# Altium footprint library base.PcbLib: 116 footprints (part 6 of 8)
Each footprint in its own frame and in the unit in brackets; x right, y up, seen from the top. Pads: shape width x height; smd on the part's side, far side on the other; paste and mask are expansions set on the pad; w line width, h text height; cw(c..) or ccw(c..) is an arc to the next point about the centre after c.
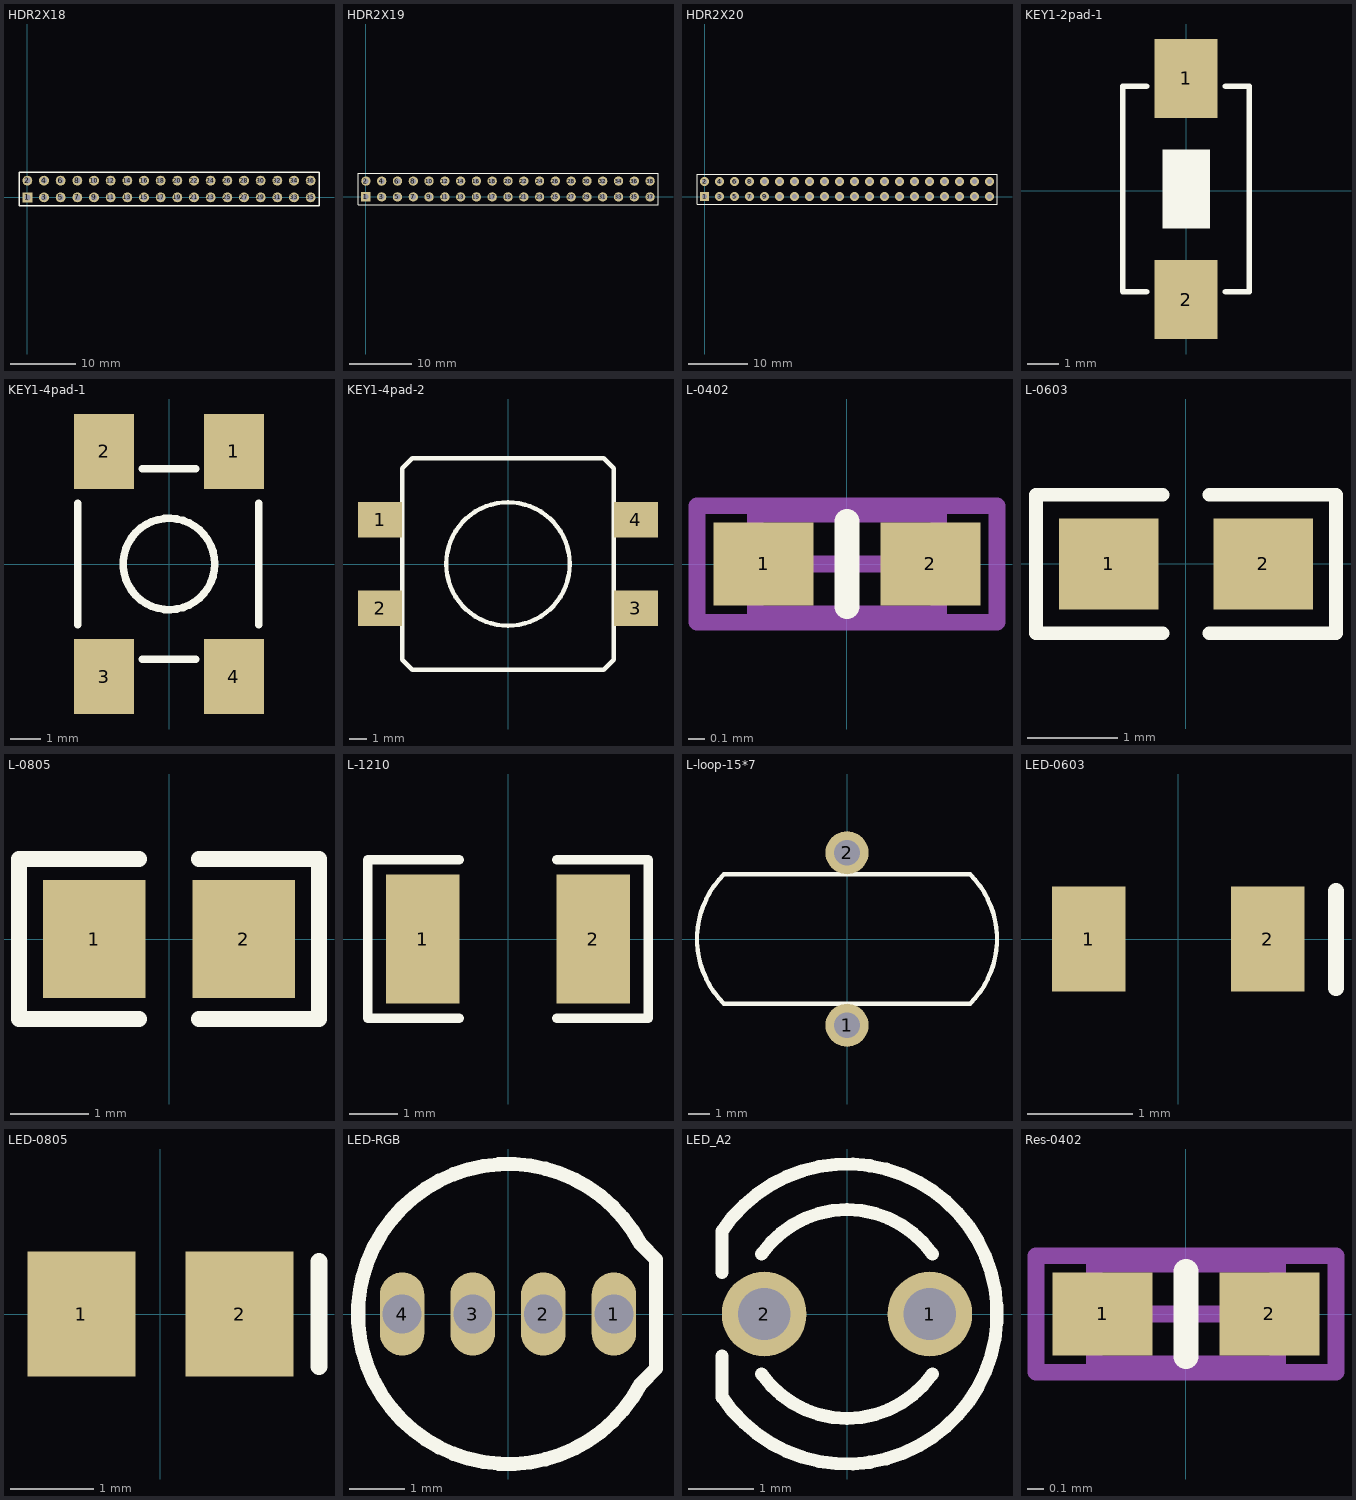
[diagram p5: the footprints below, top view; thin cyan lines are the x and y axes]

## HDR2X18 [mm] "Connector; Header; 18x2 Position"
pads (36):
  rect 1.5x1.5 hole 0.9: 1(0,0)
  round 1.5 hole 0.9: 2(0,2.54) 3(2.54,0) 4(2.54,2.54) 5(5.08,0) 6(5.08,2.54) 7(7.62,0) 8(7.62,2.54) 9(10.16,0) 10(10.16,2.54) 11(12.7,0) 12(12.7,2.54) 13(15.24,0) 14(15.24,2.54) 15(17.78,0) 16(17.78,2.54) 17(20.32,0) 18(20.32,2.54) 19(22.86,0) 20(22.86,2.54) 21(25.4,0) 22(25.4,2.54) 23(27.94,0) 24(27.94,2.54) 25(30.48,0) 26(30.48,2.54) 27(33.02,0) 28(33.02,2.54) 29(35.56,0) 30(35.56,2.54) 31(38.1,0) 32(38.1,2.54) 33(40.64,0) 34(40.64,2.54) 35(43.18,0) 36(43.18,2.54)
Top Overlay:
  lines w0.2: -1.27,-1.27 44.45,-1.27 44.45,3.81 -1.27,3.81 -1.27,-1.27
3D body "HEADER 18X2.STEP": height 10.1, standoff -1.5, extent -1.27,-1.27 44.45,3.81

## HDR2X19 [mm] "Connector; Header; 19x2 Position"
pads (38):
  rect 1.5x1.5 hole 0.9: 1(0,0)
  round 1.5 hole 0.9: 2(0,2.54) 3(2.54,0) 4(2.54,2.54) 5(5.08,0) 6(5.08,2.54) 7(7.62,0) 8(7.62,2.54) 9(10.16,0) 10(10.16,2.54) 11(12.7,0) 12(12.7,2.54) 13(15.24,0) 14(15.24,2.54) 15(17.78,0) 16(17.78,2.54) 17(20.32,0) 18(20.32,2.54) 19(22.86,0) 20(22.86,2.54) 21(25.4,0) 22(25.4,2.54) 23(27.94,0) 24(27.94,2.54) 25(30.48,0) 26(30.48,2.54) 27(33.02,0) 28(33.02,2.54) 29(35.56,0) 30(35.56,2.54) 31(38.1,0) 32(38.1,2.54) 33(40.64,0) 34(40.64,2.54) 35(43.18,0) 36(43.18,2.54) 37(45.72,0) 38(45.72,2.54)
Top Overlay:
  lines w0.2: -1.27,-1.27 -1.27,3.81 46.99,3.81 46.99,-1.27 -1.27,-1.27
3D body "HEADER 19X2.STEP": height 10.1, standoff -1.5, extent -1.27,-1.27 46.99,3.81

## HDR2X20 [mm] "Connector; Header; 20x2 Position"
pads (40):
  rect 1.5x1.5 hole 0.9: 1(0,0)
  round 1.5 hole 0.9: 2(0,2.54) 3(2.54,0) 4(2.54,2.54) 5(5.08,0) 6(5.08,2.54) 7(7.62,0) 8(7.62,2.54) 9(10.16,0) 10(10.16,2.54) 11(12.7,0) 12(12.7,2.54) 13(15.24,0) 14(15.24,2.54) 15(17.78,0) 16(17.78,2.54) 17(20.32,0) 18(20.32,2.54) 19(22.86,0) 20(22.86,2.54) 21(25.4,0) 22(25.4,2.54) 23(27.94,0) 24(27.94,2.54) 25(30.48,0) 26(30.48,2.54) 27(33.02,0) 28(33.02,2.54) 29(35.56,0) 30(35.56,2.54) 31(38.1,0) 32(38.1,2.54) 33(40.64,0) 34(40.64,2.54) 35(43.18,0) 36(43.18,2.54) 37(45.72,0) 38(45.72,2.54) 39(48.26,0) 40(48.26,2.54)
Top Overlay:
  lines w0.2: -1.27,-1.27 -1.27,3.81 49.53,3.81 49.53,-1.27 -1.27,-1.27
3D body "HEADER 20X2.STEP": height 10.1, standoff -1.5, extent -1.27,-1.27 49.53,3.81

## KEY1-2pad-1 [mm]
pads (2):
  rect 2x2.5 smd: 1(0,3.556) 2(0,-3.444)
Top Overlay:
  region: -0.747,1.309 -0.747,-1.191 0.753,-1.191 0.753,1.309
  lines w0.178: -1.25,-3.194 -2,-3.19 -2,3.306 -1.25,3.306 ; 1.25,-3.194 2,-3.194 2,3.306 1.25,3.306
3D body "User Library-switch-9.STEP": height 4.5, standoff -0.01, extent -1.725,-4.424 1.775,4.576

## KEY1-4pad-1 [mm] "6*6mm"
pads (4):
  rect 2x2.5 smd: 1(2.159,3.75) 2(-2.159,3.75) 3(-2.159,-3.75) 4(2.159,-3.75)
Top Overlay:
  circle w0.254: c0,0 r1.524
  lines w0.25: -3.048,-2.032 -3.048,2.032 ; -0.889,-3.175 0.889,-3.175 ; -0.889,3.175 0.889,3.175 ; 2.997,-2.032 2.997,2.032
3D body "SW-PB 6X6X4-SMD.STEP": height 5.5, standoff -0.03, extent -3.202,-5.021 3.142,5.013

## KEY1-4pad-2 [mm] "12*12"
pads (4):
  rect 2.5x2 smd: 1(-7.25,2.5) 2(-7.25,-2.5) 3(7.25,-2.5) 4(7.25,2.5)
Top Overlay:
  circle w0.254: c0,0 r3.5
  lines w0.25: -6,-5.43 -5.43,-6 5.43,-6 6,-5.43 6,5.43 5.43,6 -5.43,6 -6,5.43 -6,-5.43

## L-0402 [mm]
height 1.3
pads (2):
  rect 0.6x0.5 smd: 1(-0.5,0) 2(0.5,0)
Top Overlay:
  lines w0.15: 0,-0.254 0,0.254
Mechanical 13:
  lines w0.1: -0.55,-0.3 0.55,-0.3 0.55,0.3 -0.55,0.3 -0.55,-0.3
Mechanical 15:
  lines w0.1: -0.3,0 0.3,0 ; 0,-0.3 0,0.3 ; -0.9,-0.35 0.9,-0.35 0.9,0.35 -0.9,0.35 -0.9,-0.35
3D body "INDC1005(0402).STEP": height 0.49, standoff -0.01, extent -0.5,-0.305 0.5,0.295

## L-0603 [mm]
height 0.6
pads (2):
  rect 1.1x1 smd: 1(-0.85,0) 2(0.85,0)
Top Overlay:
  lines w0.15: -0.254,-0.762 -1.651,-0.762 -1.651,0.762 -0.254,0.762 ; 0.254,-0.762 1.651,-0.762 1.651,0.762 0.254,0.762
3D body "INDC1608(0603).STEP": height 0.78, standoff -0.01, extent -0.8,-0.483 0.8,0.467

## L-0805 [mm]
height 1.1
pads (2):
  rect 1.3x1.5 smd: 1(-0.95,0) 2(0.95,0)
Top Overlay:
  lines w0.2: -0.381,-1.016 -1.905,-1.016 -1.905,1.016 -0.381,1.016 ; 0.381,-1.016 1.905,-1.016 1.905,1.016 0.381,1.016
3D body "INDC2012(0805).STEP": height 0.94, standoff -0.01, extent -1,-0.6 1,0.6

## L-1210 [mil]
height 59.06
pads (2):
  rect 60x106.3 smd: 1(-70,0) 2(70,0)
Top Overlay:
  lines w7.87: -40,-65 -115,-65 -115,65 -40,65 ; 40,-65 115,-65 115,65 40,65
3D body "INDC3225(1210).STEP": height 52.76, standoff -0.39, extent -62.99,-49.21 63,49.22

## L-loop-15*7 [mm]
pads (2):
  round 2 hole 1.2: 1(0,-4) 2(0,4)
Top Overlay:
  lines w0.2: -5.715,-3 cw(c-2.715,0) -5.715,3 5.715,3 cw(c2.715,0) 5.715,-3 -5.715,-3

## LED-0603 [mm] "贴片LED"
height 1.1
pads (2):
  rect 0.7x1 smd: 1(-0.85,0) 2(0.85,0)
Top Overlay:
  lines w0.15: 1.499,-0.467 1.499,0.457
3D body "LED0603(R).STEP": height 0.6, standoff 0, extent -0.81,-0.4 0.81,0.4

## LED-0805 [mm] "贴片LED"
height 1.1
pads (2):
  rect 1.3x1.5 smd: 1(-0.95,0) 2(0.95,0)
Top Overlay:
  lines w0.2: 1.905,-0.635 1.905,0.635
3D body "LED0805(R).STEP": height 1.1, standoff 0, extent -1.01,-0.625 1.01,0.625

## LED-RGB [mm] "三基色二极管"
height 6
pads (4):
  oval 0.8x1.5 hole 0.7: 1(1.905,0) 2(0.635,0) 3(-0.635,0) 4(-1.905,0)
Top Overlay:
  lines w0.254: 2.389,-1.258 cw(c0,0) 2.389,1.258 2.667,0.98 2.667,-0.98 2.389,-1.258
3D body "LED-RGB 5mm.STEP": height 9.7, standoff -3, extent -2.9,-2.899 2.5,2.898

## LED_A2 [mm] "直径3MM LED"
height 5.5
pads (2):
  round 1.3 hole 0.8: 1(1.27,0) 2(-1.27,0)
Top Overlay:
  lines w0.2: -1.914,-1.282 -1.914,-0.641 ; -1.914,-1.276 ccw(c0,0) -1.914,1.276 -1.914,0.635 ; -1.311,-0.918 ccw(c0,0) 1.311,-0.918 ; -1.311,0.918 cw(c0,0) 1.311,0.918
3D body "3mmLED.STEP": height 4.5, standoff -10, extent -2,-2 2,2

## Res-0402 [mm]
height 1.3
pads (2):
  rect 0.6x0.5 smd: 1(-0.5,0) 2(0.5,0)
Top Overlay:
  lines w0.15: 0,-0.254 0,0.254
Mechanical 13:
  lines w0.1: -0.55,-0.3 0.55,-0.3 0.55,0.3 -0.55,0.3 -0.55,-0.3
Mechanical 15:
  lines w0.1: -0.3,0 0.3,0 ; 0,-0.3 0,0.3 ; -0.9,-0.35 0.9,-0.35 0.9,0.35 -0.9,0.35 -0.9,-0.35
3D body "RESC1005(0402).STEP": height 0.38, standoff 0, extent -0.5,-0.25 0.5,0.25